# Altium schematic symbol library Minh_Lib.SchLib: 619 symbols (part 1 of 4)
Pins are listed as number, name and electrical type; pins without a type are passive.

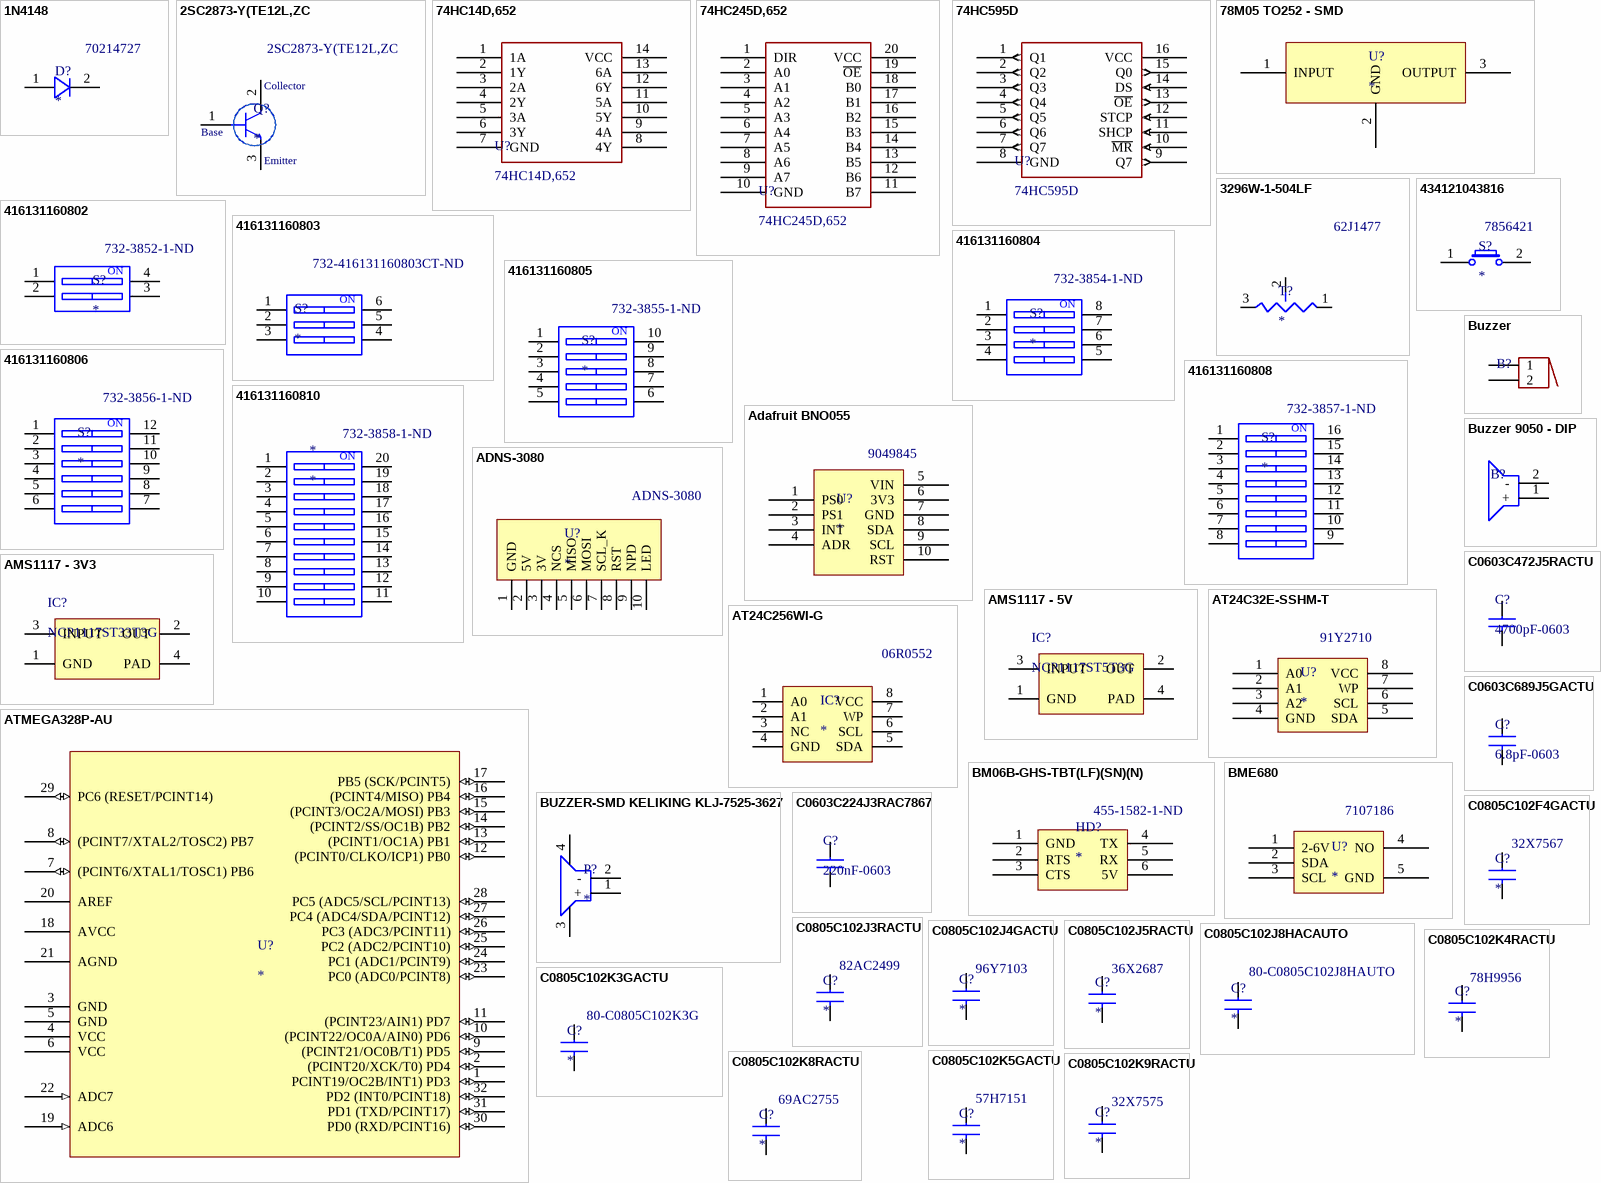
[diagram p0: symbols 1N4148 to C0805C102K9RACTU]

## 1N4148
designator D?  Supplier Part Number 1: 70214727
Rectifier Diode Small Signal Switching 100V 0.2A 4ns Automotive 2-Pin DO-35 Ammo; Manufacturer: NTE Electronics; Manufacturer Part Number: 1N4148; Forward Voltage: 1V; Element Configuration: Single; Max Repetitive Reverse Voltage (Vrrm): 75V; Forward Current: 300mA; Current Rating: 200mA; Polarity: Standard; Capacitance: 4pF; Max Forward Surge Current (Ifsm): 1A; Power Dissipation: 500mW; Supplier 1: Allied Electronics; RoHS: Yes; Category: Rectifier Diodes; Stock 1: 5690; Pricing 1: 1=0.08800 (USD); Mount: Through Hole; Case/Package: DO-35; Number of Pins: 2; Min Operating Temperature: -65°C; Max Operating Temperature: 175°C; Packaging: Tape and Reel; Reverse Recovery Time: 4ns; Voltage Rating (DC): 100V; Output Current: 200mA; Diameter: 2mm; Length: 4mm; RoHS Compliant: Yes; Lead Free: Lead Free; ComponentLink1URL: https://datasheet.ciiva.com/7624/1n4148-4448-7624426.pdf?src-supplier=Element14; ComponentLink1Description: https://datasheet.ciiva.com/7624/1n4148-4448-7624426.pdf?src-supplier=Element14
footprint SOD-80
pins: 1 Anode, 2 Cathode

## 2SC2873-Y(TE12L,ZC
designator Q?  Supplier Part Number 1: 2SC2873-Y(TE12L,ZC
Trans GP BJT NPN 50V 2A 1000mW 4-Pin(3+Tab) PW-Mini T/R; Manufacturer: Toshiba; Max Power Dissipation: 1W; Emitter Base Voltage (VEBO): 5V; Transition Frequency: 120MHz; Supplier 1: Avnet; Manufacturer Part Number: 2SC2873-Y(TE12L,ZC; RoHS: Yes; Stock 1: 4000; Pricing 1: 1000=0.17390, 2000=0.16450, 4000=0.15510, 6000=0.14570, 8000=0.13630, 10000=0.12690, 100000=0.11750 (USD); Mount: Surface Mount; Min Operating Temperature: -55°C; Max Operating Temperature: 150°C; Collector Emitter Voltage (VCEO): 50V; Collector Base Voltage (VCBO): 50V; Max Collector Current: 2A; RoHS Compliant: Yes
footprint SOT89
pins: 1, 2 3, 3 2
text: Collector; Base; Emitter

## 74HC14D,652
designator U?
Vendor: Nexperia; SourceLibrary: Nexperia_2018-05-2018; Manufacturer_Part_Number: 74HC14D,652; Copyright: Copyright (C) 2016 Accelerated Designs. All rights reserved; RefDes: RefDes; Type: DEV; Value: Value; Local Supplier: thegioiic; Local Supplier Part Number: *; Local Supplier Link: https://www.thegioiic.com/products/74hc14d
footprint SOT108-1_NEX
footprint SOP14
pins: 1 1A, 2 1Y, 3 2A, 4 2Y, 5 3A, 6 3Y, 7 GND, 8 4Y, 9 4A, 10 5Y, 11 5A, 12 6Y, 13 6A, 14 VCC

## 74HC245D,652
designator U?
Vendor: Nexperia; SourceLibrary: Nexperia_2018-05-2018; Manufacturer_Part_Number: 74HC245D,652; Copyright: Copyright (C) 2016 Accelerated Designs. All rights reserved; RefDes: RefDes; Type: DEV; Local Supplier: thegioiic; Local Supplier Part number: *; Local Supplier Link: https://www.thegioiic.com/products/74hc245d
footprint SOT163-1_NEX
footprint SOP20
pins: 1 DIR, 2 A0, 3 A1, 4 A2, 5 A3, 6 A4, 7 A5, 8 A6, 9 A7, 10 GND, 11 B7, 12 B6, 13 B5, 14 B4, 15 B3, 16 B2, 17 B1, 18 B0, 19 ~{OE}, 20 VCC

## 74HC595D
designator U?
Vendor: Nexperia; SourceLibrary: Nexperia_2018-05-2018; Manufacturer_Part_Number: 74HC595D; Copyright: Copyright (C) 2016 Accelerated Designs. All rights reserved; RefDes: RefDes; Type: DEV
footprint SOT109-1_NEX
pins: 1 Q1 (out), 2 Q2 (out), 3 Q3 (out), 4 Q4 (out), 5 Q5 (out), 6 Q6 (out), 7 Q7 (out), 8 GND (power), 9 Q7 (out), 10 ~{MR} (in), 11 SHCP (in), 12 STCP (in), 13 ~{OE} (out), 14 DS (in), 15 Q0 (out), 16 VCC (power)

## 78M05 TO252 - SMD
designator U?
footprint TO252
pins: 1 INPUT, 2 GND, 3 OUTPUT

## 3296W-1-504LF
designator T?  Supplier Part Number 1: 62J1477
Res Cermet Trimmer 500K Ohm 10% 1/2W 25(Elec)Turn 2.19mm (9.53 X 4.83 X 11.55mm) Pin Thru-Hole Tube; Manufacturer: Bourns; Manufacturer Part Number: 3296W-1-504LF; Color: Blue; Power Rating: 500mW; Resistance: 500kR; Number of Turns: 25; Temperature Coefficient: 100ppm/°C; Supplier 1: Newark; RoHS: Yes; Category: Variable Resistors and Potentiometers; Stock 1: 95; Pricing 1: 1=2.43000, 10=1.85000, 25=1.82000, 50=1.79000, 100=1.76000, 500=1.39000 (USD); Mount: Through Hole,Panel,PCB; Weight: 0.03oz; Contact Plating: Tin,Matte; Min Operating Temperature: -55°C; Max Operating Temperature: 125°C; Tolerance: 10%; Packaging: Rail/Tube; Package Quantity: 50; Resistor Type: Cermet; Termination: Pin; Taper: Linear; Max Power Dissipation: 500mW; Series: 3296; Resistance Tolerance: 10%; Technology: CERMET; Length: 9.53mm; Width: 9.53mm; Height: 11.55mm; Depth: 4.83mm; Radiation Hardening: No; Reach SVHC Compliant: Yes; Military Standard: Not; Lead Free: Lead Free; RoHS Compliant: Yes; ComponentLink1URL: https://datasheet.ciiva.com/11832/0900766b8069ccf4-11832237.pdf?src-supplier=RSComponents; ComponentLink1Description: https://datasheet.ciiva.com/11832/0900766b8069ccf4-11832237.pdf?src-supplier=RSComponents; ComponentLink2URL: https://datasheet.ciiva.com/19466/853812-19466623.pdf?src-supplier=Jameco; ComponentLink2Description: https://datasheet.ciiva.com/19466/853812-19466623.pdf?src-supplier=Jameco; ComponentLink3URL: https://datasheet.ciiva.com/29122/447286-da-01-en-trimmer-tht-3296w-1-504lf-500k-0-5w-29122370.pdf?src-supplier=Conrad; ComponentLink3Description: https://datasheet.ciiva.com/29122/447286-da-01-en-trimmer-tht-3296w-1-504lf-500k-0-5w-29122370.pdf?src-supplier=Conrad; ComponentLink4URL: https://datasheet.ciiva.com/3266/3296-3266198.pdf?src-supplier=Avnet; ComponentLink4Description: https://datasheet.ciiva.com/3266/3296-3266198.pdf?src-supplier=Avnet; ComponentLink5URL: https://datasheet.ciiva.com/15156/getdatasheetpartid-27989-15156235.pdf?src-supplier=Verical; ComponentLink5Description: https://datasheet.ciiva.com/15156/getdatasheetpartid-27989-15156235.pdf?src-supplier=Verical; ComponentLink6URL: https://datasheet.ciiva.com/2156/3296-2156894.pdf?src-supplier=Digi-Key; ComponentLink6Description: https://datasheet.ciiva.com/2156/3296-2156894.pdf?src-supplier=Digi-Key; ComponentLink7URL: https://datasheet.ciiva.com/30196/3296-30196060.pdf?src-supplier=Onlinecomponents.com; ComponentLink7Description: https://datasheet.ciiva.com/30196/3296-30196060.pdf?src-supplier=Onlinecomponents.com; ComponentLink8URL: https://datasheet.ciiva.com/16715/70153578-16715020.pdf?src-supplier=Allied+Electronics; ComponentLink8Description: https://datasheet.ciiva.com/16715/70153578-16715020.pdf?src-supplier=Allied+Electronics; ComponentLink9URL: https://datasheet.ciiva.com/1131/1815117-1131347.pdf?src-supplier=Element14; ComponentLink9Description: https://datasheet.ciiva.com/1131/1815117-1131347.pdf?src-supplier=Element14
footprint Rheostat - 3296W
pins: 1, 2, 3

## 416131160802
designator S?  Supplier Part Number 1: 732-3852-1-ND
DIP Switch Dimensions L x W x H: 5.6 x 2 mm Series: WS-DISV L: 3.58 mm Poles: 2; Manufacturer: Wurth Electronics; Manufacturer Part Number: 416131160802; Body Material: Polyphenylene,Polyphthalamide; Mechanical Life: 2000Cycles; Contact Current Rating: 25mA; Contact Resistance: 50mR; Number of Positions: 2; Voltage Rating (DC): 24V; Electrical Life: 1000Cycles; Throw Configuration: SPST; Insulation Resistance: 100MR; Actuator Type: Slide (Standard); Pitch: 0.05inch; Washable: Yes; Supplier 1: Digi-Key; RoHS: Yes; Category: DIP Switches; Stock 1: 2793; Pricing 1: 1=5.06000, 10=4.81100, 50=4.55800, 100=4.05100, 500=3.79800 (USD); Mount: Surface Mount; Contact Material: Copper Alloy,Gold; Contact Plating: Gold; Min Operating Temperature: -40°C; Max Operating Temperature: 85°C; Package Quantity: 1; Packaging: Cut Tape; Current Rating: 25mA; Termination: Gull Wing; Number of Circuits: 2; Max Voltage Rating (DC): 24V; Series: WS-DISV; Length: 0.141inch; Width: 5.6mm; Height: 2mm; Lead Free: Lead Free; RoHS Compliant: Yes; ComponentLink1URL: https://datasheet.ciiva.com/30467/0900766b812902d9-30467106.pdf?src-supplier=RSComponents; ComponentLink1Description: https://datasheet.ciiva.com/30467/0900766b812902d9-30467106.pdf?src-supplier=RSComponents; ComponentLink2URL: https://datasheet.ciiva.com/2863/4161311608xx-2863669.pdf?src-supplier=Digi-Key; ComponentLink2Description: https://datasheet.ciiva.com/2863/4161311608xx-2863669.pdf?src-supplier=Digi-Key; ComponentLink3URL: https://datasheet.ciiva.com/2863/4161311608xx-2863670.pdf?src-supplier=Digi-Key; ComponentLink3Description: https://datasheet.ciiva.com/2863/4161311608xx-2863670.pdf?src-supplier=Digi-Key
footprint DIP Switches SMD 1.27mm 2P (Wurth Elektronik - 416131160802)
pins: 1, 2, 3, 4
text: ON

## 416131160803
designator S?  Supplier Part Number 1: 732-416131160803CT-ND
Switch Slide DIP SPST 25MA 24V; Manufacturer: Wurth Electronics; Manufacturer Part Number: 416131160803; Body Material: Polyphenylene; Mechanical Life: 2000Cycles; Number of Positions: 3; Electrical Life: 1000Cycles; Actuator Type: Slide (Standard); Pitch: 0.05inch; Washable: Yes; Supplier 1: Digi-Key; RoHS: Yes; Category: DIP Switches; Stock 1: 12224; Pricing 1: 1=3.41000, 25=2.89920, 100=2.55900, 250=2.38800, 500=2.13200, 1000=2.04700 (USD); Mount: Surface Mount; Contact Plating: Gold; Min Operating Temperature: -40°C; Max Operating Temperature: 85°C; Package Quantity: 1; Packaging: Tape and Reel; Current Rating: 25mA; Voltage Rating (DC): 24V; Termination: Gull Wing; Throw Configuration: SPST; Series: WS-DISV; Length: 0.191inch; RoHS Compliant: Yes; ComponentLink1URL: https://datasheet.ciiva.com/2863/4161311608xx-2863683.pdf?src-supplier=Digi-Key; ComponentLink1Description: https://datasheet.ciiva.com/2863/4161311608xx-2863683.pdf?src-supplier=Digi-Key; ComponentLink2URL: https://datasheet.ciiva.com/2863/4161311608xx-2863682.pdf?src-supplier=Digi-Key; ComponentLink2Description: https://datasheet.ciiva.com/2863/4161311608xx-2863682.pdf?src-supplier=Digi-Key
footprint DIP Switches SMD 1.27mm 3P (Wurth Elektronik - 416131160803)
pins: 1, 2, 3, 4, 5, 6
text: ON

## 416131160804
designator S?  Supplier Part Number 1: 732-3854-1-ND
DIP Switch Dimensions L x W x H: 5.6 x 2 mm Series: WS-DISV L: 6.12 mm Poles: 4; Manufacturer: Wurth Electronics; Manufacturer Part Number: 416131160804; Body Material: Polyphenylene,Polyphthalamide; Mechanical Life: 2000Cycles; Contact Resistance: 50mR; Contact Current Rating: 25mA; Number of Positions: 4; Voltage Rating (DC): 24V; Electrical Life: 1000Cycles; Throw Configuration: SPST; Insulation Resistance: 100MR; Actuator Type: Slide (Standard); Pitch: 0.05inch; Washable: Yes; Supplier 1: Digi-Key; RoHS: Yes; Category: DIP Switches; Stock 1: 13030; Pricing 1: 1=5.25000, 10=5.08200, 50=4.81400, 100=4.27900, 500=4.01200 (USD); Mount: Surface Mount; Contact Material: Copper Alloy,Gold; Contact Plating: Gold; Min Operating Temperature: -40°C; Max Operating Temperature: 85°C; Package Quantity: 1; Packaging: Cut Tape; Current Rating: 25mA; Termination: Gull Wing; Number of Circuits: 4; Max Voltage Rating (DC): 24V; Series: WS-DISV; Length: 0.241inch; Width: 5.6mm; Height: 2mm; Reach SVHC Compliant: Yes; Lead Free: Lead Free; RoHS Compliant: Yes; ComponentLink1URL: https://datasheet.ciiva.com/30467/0900766b812902d9-30467107.pdf?src-supplier=RSComponents; ComponentLink1Description: https://datasheet.ciiva.com/30467/0900766b812902d9-30467107.pdf?src-supplier=RSComponents; ComponentLink2URL: https://datasheet.ciiva.com/1528/4161311608xx-1528928.pdf?src-supplier=Element14; ComponentLink2Description: https://datasheet.ciiva.com/1528/4161311608xx-1528928.pdf?src-supplier=Element14; ComponentLink3URL: https://datasheet.ciiva.com/2863/4161311608xx-2863702.pdf?src-supplier=Digi-Key; ComponentLink3Description: https://datasheet.ciiva.com/2863/4161311608xx-2863702.pdf?src-supplier=Digi-Key; ComponentLink4URL: https://datasheet.ciiva.com/2863/4161311608xx-2863701.pdf?src-supplier=Digi-Key; ComponentLink4Description: https://datasheet.ciiva.com/2863/4161311608xx-2863701.pdf?src-supplier=Digi-Key; ComponentLink5URL: https://datasheet.ciiva.com/1625/4161311608xx-1625344.pdf?src-supplier=Farnell; ComponentLink5Description: https://datasheet.ciiva.com/1625/4161311608xx-1625344.pdf?src-supplier=Farnell
footprint DIP Switches SMD 1.27mm 4P (Wurth Elektronik - 416131160804)
pins: 1, 2, 3, 4, 5, 6, 7, 8
text: ON

## 416131160805
designator S?  Supplier Part Number 1: 732-3855-1-ND
Switch Slide DIP SPST 25MA 24V; Manufacturer: Wurth Electronics; Manufacturer Part Number: 416131160805; Body Material: Polyphenylene; Mechanical Life: 2000Cycles; Number of Positions: 5; Electrical Life: 1000Cycles; Actuator Type: Slide (Standard); Pitch: 0.05inch; Washable: Yes; Supplier 1: Digi-Key; RoHS: Yes; Category: DIP Switches; Stock 1: 2482; Pricing 1: 1=3.63000, 25=3.08120, 100=2.71800, 250=2.53700, 500=2.26500, 1000=2.17400 (USD); Mount: Surface Mount; Contact Plating: Gold; Min Operating Temperature: -40°C; Max Operating Temperature: 85°C; Package Quantity: 1; Packaging: Tape and Reel; Current Rating: 25mA; Voltage Rating (DC): 24V; Termination: Gull Wing; Throw Configuration: SPST; Series: WS-DISV; Length: 0.291inch; RoHS Compliant: Yes; ComponentLink1URL: https://datasheet.ciiva.com/2865/4161311608xx-2865433.pdf?src-supplier=Digi-Key; ComponentLink1Description: https://datasheet.ciiva.com/2865/4161311608xx-2865433.pdf?src-supplier=Digi-Key; ComponentLink2URL: https://datasheet.ciiva.com/2865/4161311608xx-2865432.pdf?src-supplier=Digi-Key; ComponentLink2Description: https://datasheet.ciiva.com/2865/4161311608xx-2865432.pdf?src-supplier=Digi-Key
footprint DIP Switches SMD 1.27mm 5P (Wurth Elektronik - 416131160805)
pins: 1, 2, 3, 4, 5, 6, 7, 8, 9, 10
text: ON

## 416131160806
designator S?  Supplier Part Number 1: 732-3856-1-ND
Switch Slide DIP SPST 25MA 24V; Manufacturer: Wurth Electronics; Manufacturer Part Number: 416131160806; Body Material: Polyphenylene,Polyphthalamide; Mechanical Life: 2000Cycles; Contact Resistance: 50mR; Number of Positions: 6; Electrical Life: 1000Cycles; Insulation Resistance: 100MR; Actuator Type: Slide (Standard); Pitch: 0.05inch; Washable: Yes; Supplier 1: Digi-Key; RoHS: Yes; Category: DIP Switches; Stock 1: 4454; Pricing 1: 1=6.10000, 10=5.89600, 50=5.58600, 100=4.95700, 500=4.64802 (USD); Mount: Surface Mount; Contact Material: Gold; Contact Plating: Gold; Min Operating Temperature: -40°C; Max Operating Temperature: 85°C; Package Quantity: 1; Packaging: Cut Tape; Current Rating: 25mA; Voltage Rating (DC): 24V; Termination: Gull Wing; Number of Circuits: 6; Max Voltage Rating (DC): 24V; Throw Configuration: SPST; Series: WS-DISV; Length: 0.341inch; Width: 5.6mm; Height: 2mm; Reach SVHC Compliant: Yes; Lead Free: Lead Free; RoHS Compliant: Yes; ComponentLink1URL: https://datasheet.ciiva.com/2863/4161311608xx-2863760.pdf?src-supplier=Digi-Key; ComponentLink1Description: https://datasheet.ciiva.com/2863/4161311608xx-2863760.pdf?src-supplier=Digi-Key; ComponentLink2URL: https://datasheet.ciiva.com/1528/4161311608xx-1528929.pdf?src-supplier=Element14; ComponentLink2Description: https://datasheet.ciiva.com/1528/4161311608xx-1528929.pdf?src-supplier=Element14; ComponentLink3URL: https://datasheet.ciiva.com/1625/4161311608xx-1625345.pdf?src-supplier=Farnell; ComponentLink3Description: https://datasheet.ciiva.com/1625/4161311608xx-1625345.pdf?src-supplier=Farnell; ComponentLink4URL: https://datasheet.ciiva.com/2863/4161311608xx-2863761.pdf?src-supplier=Digi-Key; ComponentLink4Description: https://datasheet.ciiva.com/2863/4161311608xx-2863761.pdf?src-supplier=Digi-Key
footprint DIP Switches SMD 1.27mm 6P (Wurth Elektronik - 416131160806)
pins: 1, 2, 3, 4, 5, 6, 7, 8, 9, 10, 11, 12
text: ON

## 416131160808
designator S?  Supplier Part Number 1: 732-3857-1-ND
Switch Slide DIP SPST 25MA 24V; Manufacturer: Wurth Electronics; Manufacturer Part Number: 416131160808; Body Material: Polyphenylene,Polyphthalamide; Mechanical Life: 2000Cycles; Contact Resistance: 50mR; Number of Positions: 8; Electrical Life: 1000Cycles; Insulation Resistance: 100MR; Actuator Type: Slide (Standard); Pitch: 0.05inch; Washable: Yes; Supplier 1: Digi-Key; RoHS: Yes; Category: DIP Switches; Stock 1: 1047; Pricing 1: 1=6.80000, 10=6.57900, 50=6.23300, 100=5.54000, 500=5.19402 (USD); Mount: Surface Mount; Contact Material: Gold; Contact Plating: Gold; Min Operating Temperature: -40°C; Max Operating Temperature: 85°C; Package Quantity: 1; Packaging: Cut Tape; Current Rating: 25mA; Voltage Rating (DC): 24V; Termination: Gull Wing; Number of Circuits: 8; Max Voltage Rating (DC): 24V; Throw Configuration: SPST; Series: WS-DISV; Length: 0.441inch; Width: 5.6mm; Height: 2mm; Reach SVHC Compliant: Yes; RoHS Compliant: Yes; ComponentLink1URL: https://datasheet.ciiva.com/1528/4161311608xx-1528930.pdf?src-supplier=Element14; ComponentLink1Description: https://datasheet.ciiva.com/1528/4161311608xx-1528930.pdf?src-supplier=Element14; ComponentLink2URL: https://datasheet.ciiva.com/2863/4161311608xx-2863768.pdf?src-supplier=Digi-Key; ComponentLink2Description: https://datasheet.ciiva.com/2863/4161311608xx-2863768.pdf?src-supplier=Digi-Key; ComponentLink3URL: https://datasheet.ciiva.com/2863/4161311608xx-2863767.pdf?src-supplier=Digi-Key; ComponentLink3Description: https://datasheet.ciiva.com/2863/4161311608xx-2863767.pdf?src-supplier=Digi-Key; ComponentLink4URL: https://datasheet.ciiva.com/1625/4161311608xx-1625347.pdf?src-supplier=Farnell; ComponentLink4Description: https://datasheet.ciiva.com/1625/4161311608xx-1625347.pdf?src-supplier=Farnell
footprint DIP Switches SMD 1.27mm 8P (Wurth Elektronik - 416131160808)
pins: 1, 2, 3, 4, 5, 6, 7, 8, 9, 10, 11, 12, 13, 14, 15, 16
text: ON

## 416131160810
designator *  Supplier Part Number 1: 732-3858-1-ND
DIP Switch Dimensions L x W x H: 5.6 x 2 mm Series: WS-DISV L: 13.74 mm Poles: 10; Manufacturer: Wurth Electronics; Manufacturer Part Number: 416131160810; Body Material: Polyphenylene,Polyphthalamide; Mechanical Life: 2000Cycles; Contact Resistance: 50mR; Contact Current Rating: 25mA; Number of Positions: 10; Voltage Rating (DC): 24V; Electrical Life: 1000Cycles; Throw Configuration: SPST; Insulation Resistance: 100MR; Actuator Type: Slide (Standard); Pitch: 0.05inch; Washable: Yes; Supplier 1: Digi-Key; RoHS: Yes; Category: DIP Switches; Stock 1: 2823; Pricing 1: 1=7.97000, 10=7.70700, 50=7.30300, 100=6.49200, 500=6.08702 (USD); Mount: Surface Mount; Contact Material: Copper Alloy,Gold; Contact Plating: Gold; Min Operating Temperature: -40°C; Max Operating Temperature: 85°C; Package Quantity: 1; Packaging: Cut Tape; Current Rating: 25mA; Termination: Gull Wing; Number of Circuits: 10; Max Voltage Rating (DC): 24V; Series: WS-DISV; Length: 0.541inch; Width: 5.6mm; Height: 2mm; Reach SVHC Compliant: Yes; RoHS Compliant: Yes; ComponentLink1URL: https://datasheet.ciiva.com/30467/0900766b812902d9-30467113.pdf?src-supplier=RSComponents; ComponentLink1Description: https://datasheet.ciiva.com/30467/0900766b812902d9-30467113.pdf?src-supplier=RSComponents; ComponentLink2URL: https://datasheet.ciiva.com/2863/4161311608xx-2863792.pdf?src-supplier=Digi-Key; ComponentLink2Description: https://datasheet.ciiva.com/2863/4161311608xx-2863792.pdf?src-supplier=Digi-Key; ComponentLink3URL: https://datasheet.ciiva.com/1528/4161311608xx-1528931.pdf?src-supplier=Element14; ComponentLink3Description: https://datasheet.ciiva.com/1528/4161311608xx-1528931.pdf?src-supplier=Element14; ComponentLink4URL: https://datasheet.ciiva.com/1625/4161311608xx-1625350.pdf?src-supplier=Farnell; ComponentLink4Description: https://datasheet.ciiva.com/1625/4161311608xx-1625350.pdf?src-supplier=Farnell; ComponentLink5URL: https://datasheet.ciiva.com/2863/4161311608xx-2863793.pdf?src-supplier=Digi-Key; ComponentLink5Description: https://datasheet.ciiva.com/2863/4161311608xx-2863793.pdf?src-supplier=Digi-Key
footprint DIP Switches SMD 1.27mm 10 (Wurth Elektronik - 416131160810)
pins: 1, 2, 3, 4, 5, 6, 7, 8, 9, 10, 11, 12, 13, 14, 15, 16, 17, 18, 19, 20
text: ON

## 434121043816
designator S?  Supplier Part Number 1: 7856421
Switch Tactile Spst-no 0.05A 12V; Manufacturer: Wurth Electronics; Manufacturer Part Number: 434121043816; Mechanical Life: 50000Cycles; Actuator Material: Polymer,Liquid Crystal Polymer; Contact Current Rating: 50mA; Operating Force: 160gf; Illumination Type: Non-Illuminated,Illuminated; Throw Configuration: SPST; Insulation Resistance: 100MR; Switch Travel: 0.25mm; Switch Function: Off-Mom; Actuator Length: 0.8mm; Supplier 1: RSComponents; RoHS: Yes; Category: Tactile Switches; Stock 1: 337; Pricing 1: 1=1.69500 (USD); Mount: Surface Mount; Contact Material: Stainless Steel,Steel; Min Operating Temperature: -40°C; Max Operating Temperature: 85°C; Current Rating: 50mA; Packaging: Tape and Reel; Termination: SMD/SMT; Series: WS-TASV; Contact Type: 1 maker; Length: 8mm; Width: 3.5mm; Height: 4.3mm; REACH SVHC: No SVHC; RoHS Compliant: Yes; ComponentLink1URL: https://datasheet.ciiva.com/30466/0900766b8126b631-30466746.pdf?src-supplier=RSComponents; ComponentLink1Description: https://datasheet.ciiva.com/30466/0900766b8126b631-30466746.pdf?src-supplier=RSComponents; ComponentLink2URL: https://datasheet.ciiva.com/29123/711754-da-01-en-taster-434121043816-29123819.pdf?src-supplier=Conrad; ComponentLink2Description: https://datasheet.ciiva.com/29123/711754-da-01-en-taster-434121043816-29123819.pdf?src-supplier=Conrad; ComponentLink3URL: https://datasheet.ciiva.com/1532/434121043816-1532524.pdf?src-supplier=Element14; ComponentLink3Description: https://datasheet.ciiva.com/1532/434121043816-1532524.pdf?src-supplier=Element14; ComponentLink4URL: https://datasheet.ciiva.com/1633/434121043816-1633934.pdf?src-supplier=Farnell; ComponentLink4Description: https://datasheet.ciiva.com/1633/434121043816-1633934.pdf?src-supplier=Farnell
footprint Switches-6x3.5x4.3mm
pins: 1, 2

## Adafruit BNO055
designator U?  Supplier Part Number 1: 9049845
BNO055 Series 1.7 to 3.6 V Intelligent 9-Axis Absolute Orientation Sensor-LGA-28; Manufacturer: Bosch; Sensor Type: Accelerometer,Gyroscope,Magnetometer,3 Axis; Output Type: I2C; Supplier 1: Future Electronics; Manufacturer Part Number: BNO055; RoHS: No; Category: Inertial Measurement Units (IMUs); Pricing 1: 4000=7.70000 (USD); Mount: Surface Mount; Case/Package: LGA; Min Operating Temperature: -40°C; Max Operating Temperature: 85°C; Packaging: Tape and Reel; Lead Free: Lead Free; ComponentLink1URL: https://ae-bst.resource.bosch.com/media/_tech/media/application_notes/BST-BNO055-HS000.pdf ?src-supplier=Digi-Key; ComponentLink1Description: https://ae-bst.resource.bosch.com/media/_tech/media/application_notes/BST-BNO055-HS000.pdf ?src-supplier=Digi-Key
footprint Adafruit BNO055
pins: 1 PS0, 2 PS1, 3 INT, 4 ADR, 5 VIN (power), 6 3V3 (power), 7 GND (power), 8 SDA, 9 SCL, 10 RST

## ADNS-3080
designator U?  Supplier Part Number 1: ADNS-3080
High Performance Optical Mouse Sensor (Optimized For Gaming And Office Environments); Manufacturer: Broadcom Avago; Operating Supply Voltage: 3.3V; Frame Rate: 6400fps; Supplier 1: Avnet; Manufacturer Part Number: ADNS-3080; RoHS: Yes; Category: Embedded Processors and Controllers; Mount: Through Hole; Case/Package: PDIP; Contact Plating: Gold,Silver; Min Operating Temperature: 0°C; Max Operating Temperature: 40°C; Package Quantity: 1000; Packaging: Rail/Tube; Series: *; Lead Free: Lead Free; RoHS Compliant: Yes; ComponentLink1URL: http://www.avagotech.com/pages/en/navigation_interface_devices/navigation_sensors/led-based_sensors/adns-3080/?src-supplier=Mouser; ComponentLink1Description: http://www.avagotech.com/pages/en/navigation_interface_devices/navigation_sensors/led-based_sensors/adns-3080/?src-supplier=Mouser; ComponentLink2URL: http://www.avagotech.com/docs/AV02-0366EN?src-supplier=Avnet; ComponentLink2Description: http://www.avagotech.com/docs/AV02-0366EN?src-supplier=Avnet
footprint ADNS-3080
pins: 1 GND, 2 5V, 3 3V, 4 NCS, 5 MISO, 6 MOSI, 7 SCL_K, 8 RST, 9 NPD, 10 LED

## AMS1117 - 3V3
designator IC?, comment NCP1117ST33T3G
LDO Voltage Regulators 3.3V 1A Positive; Manufacturer: ON Semiconductor; Input Voltage MAX: 20 V; Number of Outputs: 1 Output; Output Type: Fixed; Quiescent Current: 10 mA; Dropout Voltage - Max: 1.1 V at 100 mA; Voltage Regulation Accuracy: 1 %; Dropout Voltage: 0.95 V at 100 mA; Ib - Input Bias Current: 6 mA; Line Regulation: 0.8 mV; Load Regulation: 4.3 mV; Supplier 1: Mouser; Manufacturer Part Number: NCP1117ST33T3G; RoHS: RoHS Compliant; Category: LDO Voltage Regulators; Stock 1: 0; Pricing 1: 1=0.450, 10=0.366, 100=0.223, 1000=0.173, 4000=0.147, 8000=0.137, 24000=0.130, 48000=0.127 (USD); Height: 1.69 mm (Max); Length: 6.7 mm (Max); Output Current: 1 A; Output Voltage: 3.3 V; Package / Case: SOT-223-3; Packaging: Cut Tape; Series: NCP1117; Width: 3.7 mm (Max); Brand: ON Semiconductor; Mounting Style: SMD/SMT; Maximum Operating Temperature: + 125 C; Minimum Operating Temperature: 0 C; Polarity: Positive; Standard Pack Qty: 4000; RoHS - Mouser: Y; Minimum Order Quantity: 1; Reeling: True; ComponentLink1URL: https://www.mouser.com/ds/2/308/NCP1117-D-81326.pdf; ComponentLink1Description: https://www.mouser.com/ds/2/308/NCP1117-D-81326.pdf; Supplier Part Number 1: 863-NCP1117ST33T3G
footprint SOT223-4M_AMS1117_3V3 (SOT223, 4-Leads, Body 6.5x3.5mm, Pitch 2.3mm, Lead Span 7mm, IPC Low Density)
pins: 1 GND (power), 2 OUT, 3 INPUT (power), 4 PAD

## AMS1117 - 5V
designator IC?, comment NCP1117ST5T3G
LDO Voltage Regulators 5V 1A Positive; Manufacturer: ON Semiconductor; Manufacturer Part Number: NCP1117ST33T3G; Input Voltage MAX: 20 V; Number of Outputs: 1 Output; Output Type: Fixed; Output Voltage: 3.3 V; Quiescent Current: 10 mA; Dropout Voltage - Max: 1.1 V at 100 mA; Voltage Regulation Accuracy: 1 %; Dropout Voltage: 0.95 V at 100 mA; Ib - Input Bias Current: 6 mA; Line Regulation: 0.8 mV; Load Regulation: 4.3 mV; Supplier 1: Mouser; RoHS: RoHS Compliant; Category: LDO Voltage Regulators; Stock 1: 0; Pricing 1: 1=0.450, 10=0.366, 100=0.223, 1000=0.173, 4000=0.147, 8000=0.137, 24000=0.130, 48000=0.127 (USD); Height: 1.69 mm (Max); Length: 6.7 mm (Max); Output Current: 1 A; Package / Case: SOT-223-3; Packaging: Cut Tape; Series: NCP1117; Width: 3.7 mm (Max); Brand: ON Semiconductor; Mounting Style: SMD/SMT; Maximum Operating Temperature: + 125 C; Minimum Operating Temperature: 0 C; Polarity: Positive; Standard Pack Qty: 4000; RoHS - Mouser: Y; Minimum Order Quantity: 1; Reeling: True; ComponentLink1URL: https://www.mouser.com/ds/2/308/NCP1117-D-81326.pdf; ComponentLink1Description: https://www.mouser.com/ds/2/308/NCP1117-D-81326.pdf; Supplier Part Number 1: 863-NCP1117ST33T3G
footprint SOT223-4M_AMS1117_3V3 (SOT223, 4-Leads, Body 6.5x3.5mm, Pitch 2.3mm, Lead Span 7mm, IPC Low Density)
pins: 1 GND (power), 2 OUT, 3 INPUT (power), 4 PAD

## AT24C32E-SSHM-T
designator U?  Supplier Part Number 1: 91Y2710
I²C™ Serial EEPROM, 1.7 to 3.6V, 1 MHz, -40 to 85°C, SOIC-8, RoHS; Manufacturer: Microchip; Manufacturer Part Number: AT24C32E-SSHM-T; Frequency: 1MHz; Interface: I2C,Serial,2-Wire; Min Supply Voltage: 1.7V; Density: 32Kb; Supplier 1: Newark; RoHS: Yes; Category: Uncategorized; Pricing 1: 4000=0.34000 (USD); Mount: Surface Mount; Case/Package: SOIC; Number of Pins: 8; Contact Plating: Gold; Min Operating Temperature: -40°C; Max Operating Temperature: 85°C; Packaging: Tape and Reel; Memory Type: EEPROM; Max Frequency: 1MHz; Max Supply Voltage: 3.6V; RoHS Compliant: Yes; Lead Free: Lead Free; ComponentLink1URL: http://www.microchip.com/mymicrochip/filehandler.aspx?ddocname=en590046&src-supplier=Digi-Key; ComponentLink1Description: http://www.microchip.com/mymicrochip/filehandler.aspx?ddocname=en590046&src-supplier=Digi-Key; ComponentLink2URL: http://www.atmel.com/Images/Atmel-8905-SEEPROM-AT24C32E-Datasheet.pdf?src-supplier=Avnet; ComponentLink2Description: http://www.atmel.com/Images/Atmel-8905-SEEPROM-AT24C32E-Datasheet.pdf?src-supplier=Avnet
footprint SOP8
pins: 1 A0, 2 A1, 3 A2, 4 GND, 5 SDA, 6 SCL, 7 WP, 8 VCC

## AT24C256WI-G
designator IC?  Supplier Part Number 1: 06R0552
CAT24C256 Series 256 Kb (32K X 8)  1.8 V - 5.5 V I2C CMOS Serial EEPROM - SOIC-8; Manufacturer: ON Semiconductor; Manufacturer Part Number: CAT24C256WI-G; Frequency: 400kHz; Access Time: 500ns; Memory Size: 256Kb; Interface: I2C,Serial; Max Supply Voltage: 5.5V; Min Supply Voltage: 1.8V; Memory Type: Non-Volatile,EEPROM; Max Frequency: 100kHz; Nominal Supply Current: 3mA; Access Time-Max: 900ns; Organization: 32KX8; Write Protection: YES; Operating Supply Voltage: 5V; Write Cycle Time-Max (tWC): 5ms; Supplier 1: Newark; RoHS: Yes; Category: EEPROM; Mount: Surface Mount; Case/Package: SOIC; Number of Pins: 8; Contact Plating: Gold; Min Operating Temperature: -40°C; Max Operating Temperature: 85°C; Packaging: Rail/Tube; Package Quantity: 100; Series: -; Density: 256Kb; Supply Current: 3mA; Supply Voltage-Nom: 5.5V; Radiation Hardening: No; Lead Free: Lead Free; RoHS Compliant: Yes; Reach SVHC Compliant: Yes; ComponentLink1URL: https://datasheet.ciiva.com/1166/cat24c256-d-1166416.pdf?src-supplier=Newark; ComponentLink1Description: https://datasheet.ciiva.com/1166/cat24c256-d-1166416.pdf?src-supplier=Newark; ComponentLink2URL: https://datasheet.ciiva.com/15123/getdatasheetpartid-257691-15123320.pdf?src-supplier=Verical; ComponentLink2Description: https://datasheet.ciiva.com/15123/getdatasheetpartid-257691-15123320.pdf?src-supplier=Verical; ComponentLink3URL: https://datasheet.ciiva.com/5700/cat24c256-d-5700793.pdf?src-supplier=Farnell; ComponentLink3Description: https://datasheet.ciiva.com/5700/cat24c256-d-5700793.pdf?src-supplier=Farnell; ComponentLink4URL: https://datasheet.ciiva.com/8072/cat24c256-d-8072141.pdf?src-supplier=Element14; ComponentLink4Description: https://datasheet.ciiva.com/8072/cat24c256-d-8072141.pdf?src-supplier=Element14; ComponentLink5URL: https://datasheet.ciiva.com/4859/cat24c256-d-105771-4859399.pdf?src-supplier=Mouser; ComponentLink5Description: https://datasheet.ciiva.com/4859/cat24c256-d-105771-4859399.pdf?src-supplier=Mouser; ComponentLink6URL: https://datasheet.ciiva.com/3185/cat24c256-d-3185116.pdf?src-supplier=Avnet; ComponentLink6Description: https://datasheet.ciiva.com/3185/cat24c256-d-3185116.pdf?src-supplier=Avnet; ComponentLink7URL: https://datasheet.ciiva.com/16456/cat24c256-d-16456381.pdf?src-supplier=Future+Electronics; ComponentLink7Description: https://datasheet.ciiva.com/16456/cat24c256-d-16456381.pdf?src-supplier=Future+Electronics; ComponentLink8URL: https://datasheet.ciiva.com/1912/cat24c256-d-1912247.pdf?src-supplier=Digi-Key; ComponentLink8Description: https://datasheet.ciiva.com/1912/cat24c256-d-1912247.pdf?src-supplier=Digi-Key
footprint SOP8
pins: 1 A0, 2 A1, 3 NC, 4 GND, 5 SDA, 6 SCL, 7 WP, 8 VCC

## ATMEGA328P-AU
designator U?
8-bit AVR MCU, 32 KB, 2048 Bytes, 20 MHz, 1.8 to 5.5V, TQFP-32, RoHS; Manufacturer: Microchip / Atmel; Manufacturer Part Number: ATMEGA328P-AU; Frequency: 20MHz; Interface: I2C,SPI,USART; Number of I/Os: 23; Oscillator Type: Internal; Memory Type: FLASH; Memory Size: 32KB; Peripherals: Brown-out Detect/Reset,POR,PWM,WDT; RAM Size: 2KB; Min Supply Voltage: 1.8V; Number of Timers/Counters: 3; Data Bus Width: 8b; Watchdog Timer: Yes; Number of ADC Channels: 8; Number of PWM Channels: 6; Number of SPI Channels: 1; Supplier 1: Avnet; RoHS: Yes; Category: Microcontrollers; Mount: Surface Mount; Case/Package: A; Number of Pins: 32; Weight: 0.002469oz; Min Operating Temperature: -40°C; Max Operating Temperature: 85°C; Packaging: Tray; Core Architecture: AVR; Package Quantity: 250; Max Supply Voltage: 5.5V; Number of Programmable I/O: 23; Max Frequency: 20MHz; Series: ATmega328P; Number of I2C Channels: 1; Length: 7mm; Width: 7mm; Height: 1mm; Radiation Hardening: No; RoHS Compliant: Yes; REACH SVHC: No SVHC; Lead Free: Lead Free; ComponentLink1URL: https://datasheet.ciiva.com/1166/doc8161-1166860.pdf?src-supplier=Newark; ComponentLink1Description: https://datasheet.ciiva.com/1166/doc8161-1166860.pdf?src-supplier=Newark; ComponentLink2URL: https://datasheet.ciiva.com/29119/155196-da-01-en-microcontr-atmega328p-au-8bit-tqfp-32-29119594.pdf?src-supplier=Conrad; ComponentLink2Description: https://datasheet.ciiva.com/29119/155196-da-01-en-microcontr-atmega328p-au-8bit-tqfp-32-29119594.pdf?src-supplier=Conrad; ComponentLink3URL: https://datasheet.ciiva.com/15213/getdatasheetpartid-365828-15213131.pdf?src-supplier=Verical; ComponentLink3Description: https://datasheet.ciiva.com/15213/getdatasheetpartid-365828-15213131.pdf?src-supplier=Verical; ComponentLink4URL: https://datasheet.ciiva.com/1157/1693866-1157693.pdf?src-supplier=Element14; ComponentLink4Description: https://datasheet.ciiva.com/1157/1693866-1157693.pdf?src-supplier=Element14
footprint TQFP-32
pins: 1 PCINT19/OC2B/INT1) PD3 (io), 2 (PCINT20/XCK/T0) PD4 (io), 3 GND (power), 4 VCC (power), 5 GND (power), 6 VCC (power), 7 (PCINT6/XTAL1/TOSC1) PB6 (io), 8 (PCINT7/XTAL2/TOSC2) PB7 (io), 9 (PCINT21/OC0B/T1) PD5 (io), 10 (PCINT22/OC0A/AIN0) PD6 (io), 11 (PCINT23/AIN1) PD7 (io), 12 (PCINT0/CLKO/ICP1) PB0 (io), 13 (PCINT1/OC1A) PB1 (io), 14 (PCINT2/SS/OC1B) PB2 (io), 15 (PCINT3/OC2A/MOSI) PB3 (io), 16 (PCINT4/MISO) PB4 (io), 17 PB5 (SCK/PCINT5) (io), 18 AVCC (power), 19 ADC6 (in), 20 AREF, 21 AGND (power), 22 ADC7 (in), 23 PC0 (ADC0/PCINT8) (io), 24 PC1 (ADC1/PCINT9) (io), 25 PC2 (ADC2/PCINT10) (io), 26 PC3 (ADC3/PCINT11) (io), 27 PC4 (ADC4/SDA/PCINT12) (io), 28 PC5 (ADC5/SCL/PCINT13) (io), 29 PC6 (RESET/PCINT14) (io), 30 PD0 (RXD/PCINT16) (io), 31 PD1 (TXD/PCINT17) (io), 32 PD2 (INT0/PCINT18) (io)

## BM06B-GHS-TBT(LF)(SN)(N)
designator HD?  Supplier Part Number 1: 455-1582-1-ND
Conn Shrouded Header (4 Sides) HDR 6 POS 1.25mm Solder ST Top Entry SMD T/R; Manufacturer: JST; Manufacturer Part Number: BM06B-GHS-TBT(LF)(SN)(N); Number of Positions: 6; Connector Type: Outer Shroud Contact; Max Current Rating: 1A; Max Voltage Rating (AC): 50V; Contact Resistance: 50mR; Pitch: 0.049inch; Supplier 1: Digi-Key; RoHS: Yes; Category: Connectors; Stock 1: 8198; Pricing 1: 1=0.52000, 10=0.45400, 100=0.37450, 500=0.32564, 1000=0.26866 (USD); Mount: Surface Mount; Housing Color: Beige; Housing Material: Polyamide; Contact Material: Bronze; Color: Natural; Contact Plating: Tin,Copper; Min Operating Temperature: -25°C; Max Operating Temperature: 85°C; Orientation: Straight; Number of Rows: 1; Packaging: Tape and Reel; Termination: Solder; Fastening Type: Ramp; Length: 10.75mm; Depth: 4.25mm; Lead Free: Lead Free; ComponentLink1URL: https://datasheet.ciiva.com/730/egh-730626.pdf?src-supplier=Digi-Key; ComponentLink1Description: https://datasheet.ciiva.com/730/egh-730626.pdf?src-supplier=Digi-Key; ComponentLink2URL: https://datasheet.ciiva.com/712/egh-712475.pdf?src-supplier=Digi-Key; ComponentLink2Description: https://datasheet.ciiva.com/712/egh-712475.pdf?src-supplier=Digi-Key; ComponentLink3URL: https://datasheet.ciiva.com/712/egh-712476.pdf?src-supplier=Digi-Key; ComponentLink3Description: https://datasheet.ciiva.com/712/egh-712476.pdf?src-supplier=Digi-Key
footprint BM06B-GHS-TBT (JST - GH - 6 PORT)
pins: 1 GND, 2 RTS, 3 CTS, 4 TX, 5 RX, 6 5V

## BME680
designator U?  Supplier Part Number 1: 7107186
Pimoroni.com - Pressure, Temperature and Humidity Sensor Digital Output 1.8V 8-Pin LGA; Manufacturer: Bosch Sensortec; Manufacturer Part Number: BME680; Output Type: SPI,I2C; Supplier 1: Future Electronics; RoHS: No; Category: Uncategorized; Stock 1: 64; Pricing 1: 1=9.84000, 20=8.81000, 125=8.18000, 500=7.71000, 3000=7.09000 (USD); Min Operating Temperature: -40°C; Max Operating Temperature: 85°C; Sensor Type: Temperature; ComponentLink1URL: https://ae-bst.resource.bosch.com/media/_tech/media/application_notes/BST-BME680-HS000-05.pdf?src-supplier=Digi-Key; ComponentLink1Description: https://ae-bst.resource.bosch.com/media/_tech/media/application_notes/BST-BME680-HS000-05.pdf?src-supplier=Digi-Key; ComponentLink2URL: https://ae-bst.resource.bosch.com/media/_tech/media/product_flyer/BST-BME680-FL000.pdf?src-supplier=Digi-Key; ComponentLink2Description: https://ae-bst.resource.bosch.com/media/_tech/media/product_flyer/BST-BME680-FL000.pdf?src-supplier=Digi-Key
footprint BME680 (Pimoroni Robot)
pins: 1 2-6V (power), 2 SDA, 3 SCL, 4 NO, 5 GND (power)

## Buzzer
designator B?  (value not drawn)
Local Supplier: thegioiic; Local Supplier Link: https://www.thegioiic.com/products/1209-dip-buzzer-12x9mm; Local Supplier Part Number: 1209 DIP Buzzer 12x9mm
footprint BUZZER
pins: 1, 2

## Buzzer 9050 - DIP
designator B?, comment Buzzer  (value not drawn)
9050 DIP Buzzer 9x5mm 60dB; Local Supplier: thegioiic; Local Supplier Link: https://www.thegioiic.com/products/1209-dip-buzzer-12x9mm; Local Supplier Part Number: 1209 DIP Buzzer 12x9mm
footprint Buzzer 9x5mm 60dB (9050 DIP)
pins: 1 +, 2 -

## BUZZER-SMD KELIKING KLJ-7525-3627
designator P?
footprint KELIKING KLJ-7525-3627 (Buzzer SMD - 7.5x7.5x2.5mm 2700Hz 85dB)
pins: 1 +, 2 -, 3, 4

## C0603C224J3RAC7867
designator C?, comment 220nF-0603
CAP CER 0.22UF 25V X7R 0603; Manufacturer: KEMET; Manufacturer Part Number: C0603C224J3RAC7867; Tolerance: ±5%; Notification: Current market demand for these product types have resulted in fluctuating and extending lead times. Lead times may differ.; Supplier 1: Digi-Key; RoHS: RoHS Compliant; Category: Capacitors; Stock 1: 12832; Pricing 1: 1=0.48, 10=0.334, 100=0.2006, 500=0.15042, 1000=0.12702 (USD); Packaging: Cut Tape (CT); Part Status: Active; Voltage - Rated: 25V; Temperature Coefficient: X7R; Operating Temperature: -55°C ~ 125°C; Features: -; Ratings: -; Applications: General Purpose; Failure Rate: -; Mounting Type: Surface Mount, MLCC; Package / Case: 0603 (1608 Metric); Size / Dimension: 0.063" L x 0.032" W (1.60mm x 0.80mm); Height - Seated (Max): -; Thickness (Max): 0.034" (0.87mm); Lead Spacing: -; Lead Style: -; ComponentLink1URL: https://api.kemet.com/component-edge/download/datasheet/C0603C224J3RAC7867.pdf; ComponentLink1Description: https://api.kemet.com/component-edge/download/datasheet/C0603C224J3RAC7867.pdf; Supplier Part Number 1: 399-9967-1-ND
footprint CAP0603
pins: 1, 2

## C0603C472J5RACTU
designator C?, comment 4700pF-0603
CAP CER 4700PF 50V X7R 0603; Manufacturer: KEMET; Manufacturer Part Number: C0603C472J5RACTU; Tolerance: ±5%; Supplier 1: Digi-Key; RoHS: RoHS Compliant; Category: Capacitors; Stock 1: 111532; Pricing 1: 1=0.1, 10=0.042, 100=0.0186, 500=0.01328, 1000=0.01044 (USD); Packaging: Cut Tape (CT); Part Status: Active; Voltage - Rated: 50V; Temperature Coefficient: X7R; Operating Temperature: -55°C ~ 125°C; Features: -; Ratings: -; Applications: General Purpose; Failure Rate: -; Mounting Type: Surface Mount, MLCC; Package / Case: 0603 (1608 Metric); Size / Dimension: 0.063" L x 0.032" W (1.60mm x 0.80mm); Height - Seated (Max): -; Thickness (Max): 0.034" (0.87mm); Lead Spacing: -; Lead Style: -; ComponentLink1URL: http://www.kemet.com/docfinder?Partnumber=C0603C472J5RACTU; ComponentLink1Description: http://www.kemet.com/docfinder?Partnumber=C0603C472J5RACTU; Supplier Part Number 1: 399-1088-1-ND; Value: 4700pF
footprint CAP0603
pins: 1, 2

## C0603C689J5GACTU
designator C?, comment 6.8pF-0603